# Altium footprint library RODION.PcbLib: 131 footprints (part 9 of 9)
Each footprint in its own frame and in the unit in brackets; x right, y up, seen from the top. Pads: shape width x height; smd on the part's side, far side on the other; paste and mask are expansions set on the pad; w line width, h text height; cw(c..) or ccw(c..) is an arc to the next point about the centre after c.
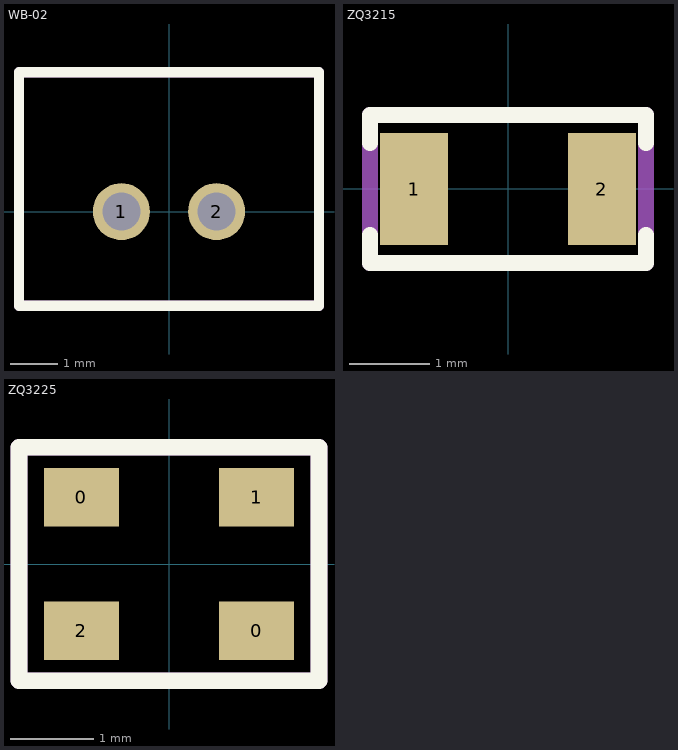
[diagram p8: the footprints below, top view; thin cyan lines are the x and y axes]

## WB-02 [mm] "WB-02 ()MW-02) Connector 2 pin"
height 6.1
pads (2):
  round 1.2 hole 0.8: 1(-1,0) 2(1,0)
Top Overlay:
  lines w0.22: -3.15,-1.975 3.15,-1.975 3.15,2.925 -3.15,2.925 -3.15,-1.975
Top_Assy:
  lines w0.22: -3.15,-1.975 3.15,-1.975 3.15,2.925 -3.15,2.925 -3.15,-1.975
  text ".Designator" at -2,-0.25 h1
3D body "WB-02.step": height 6, standoff -3.2, extent -3,-1.8 3,2.7

## ZQ3215 [mm] "Chip Crystal, Body 3.2*1.5mm"
height 0.75
pads (2):
  rect 0.85x1.4 smd: 1(-1.175,0) 2(1.175,0)
Top Overlay:
  lines w0.2: -1.725,-0.575 -1.725,-0.925 1.7,-0.925 ; -1.725,0.575 -1.725,0.925 1.7,0.925 ; 1.725,-0.925 1.725,-0.575 ; 1.725,0.575 1.725,0.925
Top_Assy:
  lines w0.2: -1.725,-0.925 -1.725,0.925 1.725,0.925 1.725,-0.925 -1.725,-0.925
  text ".Designator" at -1.85,-0.3 h1
3D body "CRYSTAL_SMD_3215.STEP": height 0.91, standoff 0, extent -1.61,-0.76 1.61,0.76

## ZQ3225 [mm]
height 0.75
pads (4):
  rect 0.9x0.7 smd: 0(-1.05,0.8) 0(1.05,-0.8) 1(1.05,0.8) 2(-1.05,-0.8)
Top Overlay:
  lines w0.2: -1.8,-1.4 1.8,-1.4 1.8,1.4 -1.8,1.4 -1.8,-1.4
Top_Assy:
  lines w0.2: -1.8,-1.4 1.8,-1.4 1.8,1.4 -1.8,1.4 -1.8,-1.4
  text ".Designator" at -1.95,-0.175 h1
3D body "CRYSTAL_SMD_3225.STEP": height 0.61, standoff 0, extent -1.6,-1.25 1.6,1.25